# Altium footprint library Footprints.PcbLib: 266 footprints (part 10 of 17)
Each footprint in its own frame and in the unit in brackets; x right, y up, seen from the top. Pads: shape width x height; smd on the part's side, far side on the other; paste and mask are expansions set on the pad; w line width, h text height; cw(c..) or ccw(c..) is an arc to the next point about the centre after c.
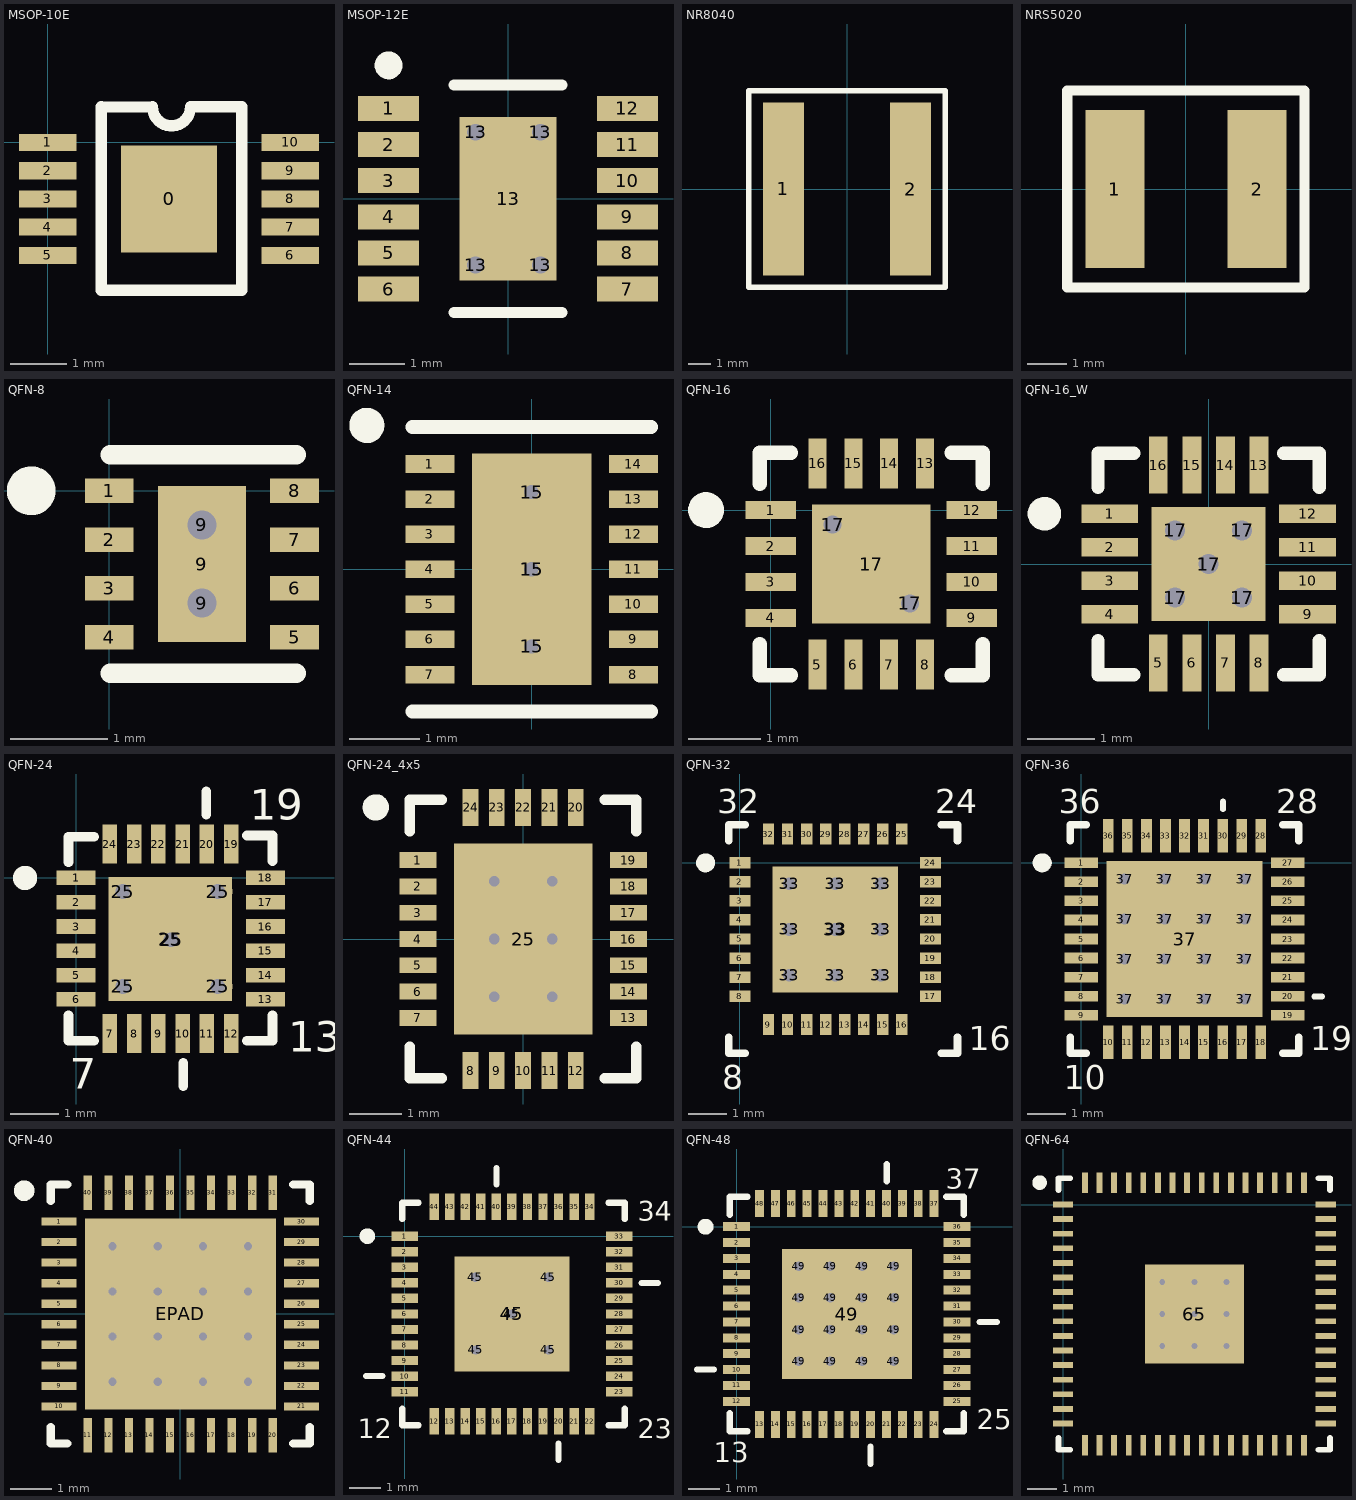
[diagram p9: the footprints below, top view; thin cyan lines are the x and y axes]

## MSOP-10E [mil] "TSOP, 10-Leads, Pitch 0,5mm, Exp PAD, IPC Medium Density"
pads (11):
  rect 66.93x74.8 smd: 0(84.65,-39.37)
  rect 40x12 smd: 1(0,0) 2(0,-19.68) 3(0,-39.37) 4(0,-59.05) 5(0,-78.74) 6(169.29,-78.74) 7(169.29,-59.05) 8(169.29,-39.37) 9(169.29,-19.68) 10(169.29,0)
Top Overlay:
  lines w7.87: 37.38,24 37.38,-103 135.41,-103 135.41,24 ; 37.38,24.84 73.1,24.8 ; 73.14,24.84 ccw(c86.39,24.84) 99.65,24.84 ; 99.6,24.9 135.41,24.84
3D body "User Library-msop-10.STEP": height 45.28, standoff 0, extent -11.81,-98.42 181.1,19.69

## MSOP-12E [mm] "TSOP, 12-Leads, Body 4,1x3,1mm (max), Pitch 0,65mm, Exp PAD, IPC Medium Density"
height 1.1
pads (17):
  rect 1.1x0.45 smd mask+0.076: 1(-2.15,1.625) 2(-2.15,0.975) 3(-2.15,0.325) 4(-2.15,-0.325) 5(-2.15,-0.975) 6(-2.15,-1.625) 7(2.15,-1.625) 8(2.15,-0.975) 9(2.15,-0.325) 10(2.15,0.325) 11(2.15,0.975) 12(2.15,1.625)
  round 0.5 hole 0.3: 13(-0.584,-1.194) 13(-0.584,1.194) 13(0.584,-1.194) 13(0.584,1.194)
  rect 1.75x2.95 smd paste-200 mask+0.076: 13(0,0)
Top Overlay:
  circle w0.25: c-2.15,2.4 r0.125
  lines w0.2: -0.975,-2.05 0.975,-2.05 ; -0.975,2.05 0.975,2.05
Top Paste:
  rectangle: -0.584,-0.94 0.584,0.94
3D body "User Library-msop-12.STEP": height 1.1, standoff 0, extent -2.475,-2.008 2.425,2.032

## NR8040 [mm]
pads (2):
  rect 1.8x7.6 smd: 1(-2.8,0) 2(2.8,0)
Top Overlay:
  lines w0.254: -4.318,-4.318 4.318,-4.318 4.318,4.318 -4.318,4.318 -4.318,-4.318
3D body: height 4.3, standoff 0.1, extent -3.556,-3.81 3.556,3.81

## NRS5020 [mm]
pads (2):
  rect 1.5x4 smd: 1(-1.8,0) 2(1.8,0)
Top Overlay:
  lines w0.254: -3.008,-2.5 -3.008,2.492 ; -3,-2.5 3,-2.5 ; -3,2.5 3,2.5 ; 3.008,-2.492 3.008,2.5
3D body: height 2.1, standoff 0.1, extent -2.286,-2.032 2.286,2.032

## QFN-8 [mm] "QFN, 8-Leads, Body 2,1x2,1mm (max), Pitch 0,50mm, IPC Medium Density"
height 0.8
pads (11):
  rect 0.5x0.25 smd mask+0.07: 1(0,0) 2(0,-0.5) 3(0,-1) 4(0,-1.5) 5(1.9,-1.5) 6(1.9,-1) 7(1.9,-0.5) 8(1.9,0)
  round 0.508 hole 0.3: 9(0.95,-1.15) 9(0.95,-0.35)
  rect 0.9x1.6 smd paste-0.12 mask+0.07: 9(0.95,-0.75)
Top Overlay:
  circle w0.25: c-0.8,0 r0.125
  lines w0.2: 0.01,-1.868 1.915,-1.868 ; 0.01,0.368 1.915,0.368
3D body: height 0.8, standoff 0.05, extent -0.038,-1.753 1.968,0.254

## QFN-14 [mm] "QFN, 14-Leads, Body 4,00x3,00mm, Pitch 0,50mm, Thermal Pad 3,30x1,70mm, IPC Medium Density"
height 1
pads (18):
  rect 0.7x0.25 smd: 1(-1.45,1.5) 2(-1.45,1) 3(-1.45,0.5) 4(-1.45,0) 5(-1.45,-0.5) 6(-1.45,-1) 7(-1.45,-1.5) 8(1.45,-1.5) 9(1.45,-1) 10(1.45,-0.5) 11(1.45,0) 12(1.45,0.5) 13(1.45,1) 14(1.45,1.5)
  round 0.5 hole 0.2: 15(0,-1.1) 15(0,0) 15(0,1.1)
  rect 1.7x3.3 smd: 15(0,0)
Top Overlay:
  circle w0.25: c-2.35,2.05 r0.125
  lines w0.2: -1.7,-2.025 1.7,-2.025 ; -1.7,2.025 1.7,2.025
3D body: height 1, standoff 0, extent -1.5,-2 1.5,2

## QFN-16 [mm] "QFN, 16-Leads, Body 3.0x3.0mm (max), Pitch 0.50mm, IPC Medium Density"
height 0.9
pads (19):
  rect 0.7x0.25 smd: 1(0,0) 2(0,-0.5) 3(0,-1) 4(0,-1.5) 9(2.8,-1.5) 10(2.8,-1) 11(2.8,-0.5) 12(2.8,0)
  rect 0.25x0.7 smd: 5(0.65,-2.15) 6(1.15,-2.15) 7(1.65,-2.15) 8(2.15,-2.15) 13(2.15,0.65) 14(1.65,0.65) 15(1.15,0.65) 16(0.65,0.65)
  round 0.559 hole 0.25: 17(0.864,-0.203) 17(1.936,-1.297)
  rect 1.65x1.65 smd paste-0.381: 17(1.4,-0.75)
Top Overlay:
  circle w0.25: c-0.9,0 r0.125
  lines w0.2: -0.15,-1.868 -0.15,-2.3 0.282,-2.3 ; -0.15,0.368 -0.15,0.8 0.282,0.8 ; 2.518,-2.3 2.95,-2.3 2.95,-1.868 ; 2.518,0.8 2.95,0.8 2.95,0.368
3D body "User Library-QFN-16_3x3.STEP": height 0.9, standoff 0, extent -0.127,-2.283 2.915,0.759

## QFN-16_W [mm] "QFN, 16-Leads, Body 3,3x3,3mm (max), Pitch 0,50mm, IPC Medium Density"
height 0.8
pads (22):
  rect 0.85x0.28 smd mask+0.076: 1(-1.475,0.75) 2(-1.475,0.25) 3(-1.475,-0.25) 4(-1.475,-0.75) 9(1.475,-0.75) 10(1.475,-0.25) 11(1.475,0.25) 12(1.475,0.75)
  rect 0.28x0.85 smd mask+0.076: 5(-0.75,-1.475) 6(-0.25,-1.475) 7(0.25,-1.475) 8(0.75,-1.475) 13(0.75,1.475) 14(0.25,1.475) 15(-0.25,1.475) 16(-0.75,1.475)
  round 0.559 hole 0.3: 17(-0.5,-0.5) 17(-0.5,0.5) 17(0,0) 17(0.5,-0.5) 17(0.5,0.5)
  rect 1.7x1.7 smd paste-100 mask+0.076: 17(0,0)
Top Overlay:
  circle w0.25: c-2.45,0.75 r0.125
  lines w0.2: -1.65,-1.143 -1.65,-1.65 -1.118,-1.65 ; -1.65,1.143 -1.65,1.65 -1.118,1.65 ; 1.118,-1.65 1.65,-1.65 1.65,-1.143 ; 1.118,1.65 1.65,1.65 1.65,1.143
Top Paste:
  rectangle: 0.1,0.1 0.8,0.8
  region: -0.1,0.8 -0.8,0.8 -0.8,0.1 -0.1,0.1
  region: -0.1,-0.1 -0.8,-0.1 -0.8,-0.8 -0.1,-0.8
  rectangle: 0.1,-0.8 0.8,-0.1
3D body: height 0.8, standoff 0.08, extent -1.65,-1.65 1.65,1.65

## QFN-24 [mm] "QFN, 24-Leads, Body 4,1x4,1mm (max), Pitch 0,50mm, IPC Low Density"
height 0.8
pads (30):
  rect 0.8x0.3 smd mask+0.07: 1(0,0) 2(0,-0.5) 3(0,-1) 4(0,-1.5) 5(0,-2) 6(0,-2.5) 13(3.9,-2.5) 14(3.9,-2) 15(3.9,-1.5) 16(3.9,-1) 17(3.9,-0.5) 18(3.9,0)
  rect 0.3x0.8 smd mask+0.07: 7(0.696,-3.204) 8(1.196,-3.204) 9(1.696,-3.204) 10(2.196,-3.204) 11(2.696,-3.204) 12(3.196,-3.204) 19(3.196,0.696) 20(2.696,0.696) 21(2.196,0.696) 22(1.696,0.696) 23(1.196,0.696) 24(0.696,0.696)
  round 0.6 hole 0.3 mask+0.07: 25(0.965,-2.235) 25(0.965,-0.279) 25(1.956,-1.27) 25(2.921,-2.235) 25(2.921,-0.279)
  rect 2.55x2.55 smd paste-200 mask+0.07: 25(1.941,-1.26)
Top Overlay:
  circle w0.25: c-1.05,0 r0.125
  lines w0.2: -0.155,-2.826 -0.155,-3.351 0.37,-3.351 ; -0.155,0.326 -0.155,0.851 0.37,0.851 ; 2.21,-4.293 2.21,-3.81 ; 2.682,1.302 2.682,1.785 ; 3.522,-3.351 4.047,-3.351 4.047,-2.826 ; 3.522,0.876 4.047,0.876 4.047,0.351
  text "7" at -0.127,-4.343 h0.64
  text "13" at 4.369,-3.581 h0.64
  text "19" at 3.581,1.194 h0.64
Top Paste:
  rectangle: 2.088,-2.393 3.088,-1.393
  region: 0.838,-1.393 0.838,-2.393 1.838,-2.393 1.838,-1.393
  rectangle: 2.088,-1.143 3.088,-0.143
  rectangle: 0.838,-1.143 1.838,-0.143
3D body "User Library-QFN24_4x4.STEP": height 1, standoff 0, extent -0.069,-3.273 3.951,0.747

## QFN-24_4x5 [mm] "24-pin QFN 4x5mm"
height 1
pads (25):
  rect 0.7x0.3 smd: 1(-2,1.5) 2(-2,1) 3(-2,0.5) 4(-2,0) 5(-2,-0.5) 6(-2,-1) 7(-2,-1.5) 13(2,-1.5) 14(2,-1) 15(2,-0.5) 16(2,0) 17(2,0.5) 18(2,1) 19(2,1.5)
  rect 0.3x0.7 smd: 8(-1,-2.5) 9(-0.5,-2.5) 10(0,-2.5) 11(0.5,-2.5) 12(1,-2.5) 20(1,2.5) 21(0.5,2.5) 22(0,2.5) 23(-0.5,2.5) 24(-1,2.5)
  rect 2.63x3.63 smd: 25(0,0)
via 0.55,-1.1 diameter 0.5 hole 0.2
via -0.55,-1.1 diameter 0.5 hole 0.2
via 0.55,0 diameter 0.5 hole 0.2
via -0.55,0 diameter 0.5 hole 0.2
via 0.55,1.1 diameter 0.5 hole 0.2
via -0.55,1.1 diameter 0.5 hole 0.2
Top Overlay:
  circle w0.25: c-2.8,2.5 r0.125
  lines w0.2: -2.15,-2.05 -2.15,-2.65 -1.55,-2.65 ; -2.15,2.05 -2.15,2.65 -1.55,2.65 ; 1.55,-2.65 2.15,-2.65 2.15,-2.05 ; 1.55,2.65 2.15,2.65 2.15,2.05
3D body: height 1, standoff 0, extent -2,-2.5 2,2.5

## QFN-32 [mm]
height 0.8
pads (42):
  rect 0.55x0.3 smd: 1(0,0) 2(0,-0.5) 3(0,-1) 4(0,-1.5) 5(0,-2) 6(0,-2.5) 7(0,-3) 8(0,-3.5) 17(5,-3.5) 18(5,-3) 19(5,-2.5) 20(5,-2) 21(5,-1.5) 22(5,-1) 23(5,-0.5) 24(5,0)
  rect 0.3x0.55 smd: 9(0.75,-4.25) 10(1.25,-4.25) 11(1.75,-4.25) 12(2.25,-4.25) 13(2.75,-4.25) 14(3.25,-4.25) 15(3.75,-4.25) 16(4.25,-4.25) 25(4.25,0.75) 26(3.75,0.75) 27(3.25,0.75) 28(2.75,0.75) 29(2.25,0.75) 30(1.75,0.75) 31(1.25,0.75) 32(0.75,0.75)
  round 0.66 hole 0.33: 33(1.3,-2.95) 33(1.3,-1.75) 33(1.3,-0.55) 33(2.5,-2.95) 33(2.5,-1.75) 33(2.5,-0.55) 33(3.7,-2.95) 33(3.7,-1.75) 33(3.7,-0.55)
  rect 3.3x3.3 smd paste-200: 33(2.5,-1.75)
Top Overlay:
  circle w0.25: c-0.9,0 r0.125
  lines w0.2: -0.29,-4.575 -0.29,-5 0.135,-5 ; -0.29,0.575 -0.29,1 0.135,1 ; 5.285,-5 5.71,-5 5.71,-4.575 ; 5.285,1 5.71,1 5.71,0.575
  text "8" at -0.465,-5.937 h0.64
  text "16" at 6.012,-4.921 h0.64
  text "24" at 5.123,1.302 h0.64
  text "32" at -0.592,1.302 h0.64
Top Paste:
  rectangle: 1.45,-1.65 2.375,-0.725
  rectangle: 2.65,-1.65 3.575,-0.725
  rectangle: 2.65,-2.85 3.575,-1.925
  rectangle: 1.45,-2.85 2.375,-1.925
3D body "User Library-qfn32-5x5.STEP": height 0.8, standoff 0, extent -0.02,-4.26 5,0.76

## QFN-36 [mm] "36-Pin Quad Flat No-lead (QFN)"
height 0.9
pads (53):
  rect 0.89x0.28 smd mask+0.07: 1(0,0) 2(0,-0.5) 3(0,-1) 4(0,-1.5) 5(0,-2) 6(0,-2.5) 7(0,-3) 8(0,-3.5) 9(0,-4) 19(5.42,-4) 20(5.42,-3.5) 21(5.42,-3) 22(5.42,-2.5) 23(5.42,-2) 24(5.42,-1.5) 25(5.42,-1) 26(5.42,-0.5) 27(5.42,0)
  rect 0.28x0.89 smd mask+0.07: 10(0.71,-4.71) 11(1.21,-4.71) 12(1.71,-4.71) 13(2.21,-4.71) 14(2.71,-4.71) 15(3.21,-4.71) 16(3.71,-4.71) 17(4.21,-4.71) 18(4.71,-4.71) 28(4.71,0.71) 29(4.21,0.71) 30(3.71,0.71) 31(3.21,0.71) 32(2.71,0.71) 33(2.21,0.71) 34(1.71,0.71) 35(1.21,0.71) 36(0.71,0.71)
  round 0.559 hole 0.3: 37(1.135,-3.575) 37(1.135,-2.525) 37(1.135,-1.475) 37(1.135,-0.425) 37(2.185,-3.575) 37(2.185,-2.525) 37(2.185,-1.475) 37(2.185,-0.425) 37(3.235,-3.575) 37(3.235,-2.525) 37(3.235,-1.475) 37(3.235,-0.425) 37(4.285,-3.575) 37(4.285,-2.525) 37(4.285,-1.475) 37(4.285,-0.425)
  rect 4.1x4.1 smd paste-200 mask+0.07: 37(2.71,-2)
Top Overlay:
  circle w0.25: c-1.025,0 r0.125
  lines w0.152: 3.717,1.404 3.717,1.607 ; 6.114,-3.507 6.317,-3.507
  lines w0.2: -0.29,-4.575 -0.29,-5 0.135,-5 ; -0.29,0.575 -0.29,1 0.135,1 ; 5.285,-5 5.71,-5 5.71,-4.575 ; 5.285,1 5.71,1 5.71,0.575
  text "10" at -0.465,-5.937 h0.64
  text "19" at 6.012,-4.921 h0.64
  text "28" at 5.123,1.302 h0.64
  text "36" at -0.592,1.302 h0.64
Top Paste:
  rectangle: 0.742,-0.832 1.542,-0.032
  rectangle: 1.792,-0.832 2.592,-0.032
  rectangle: 2.842,-0.832 3.642,-0.032
  rectangle: 3.892,-0.832 4.692,-0.032
  rectangle: 3.892,-1.882 4.692,-1.082
  rectangle: 2.842,-1.882 3.642,-1.082
  rectangle: 1.792,-1.882 2.592,-1.082
  rectangle: 0.742,-1.882 1.542,-1.082
  rectangle: 0.742,-2.932 1.542,-2.132
  rectangle: 1.792,-2.932 2.592,-2.132
  rectangle: 2.842,-2.932 3.642,-2.132
  rectangle: 3.892,-2.932 4.692,-2.132
  rectangle: 3.892,-3.982 4.692,-3.182
  rectangle: 2.842,-3.982 3.642,-3.182
  rectangle: 1.792,-3.982 2.592,-3.182
  rectangle: 0.742,-3.982 1.542,-3.182
3D body "User Library-QFN36 (6x6).STEP": height 0.9, standoff 0.01, extent -0.381,-5.084 5.824,1.121

## QFN-40 [mm] "40-pin 6mm x 6mm QFN"
height 0.8
pads (41):
  rect 0.85x0.2 smd: 1(-2.95,2.25) 2(-2.95,1.75) 3(-2.95,1.25) 4(-2.95,0.75) 5(-2.95,0.25) 6(-2.95,-0.25) 7(-2.95,-0.75) 8(-2.95,-1.25) 9(-2.95,-1.75) 10(-2.95,-2.25) 21(2.95,-2.25) 22(2.95,-1.75) 23(2.95,-1.25) 24(2.95,-0.75) 25(2.95,-0.25) 26(2.95,0.25) 27(2.95,0.75) 28(2.95,1.25) 29(2.95,1.75) 30(2.95,2.25)
  rect 0.2x0.85 smd: 11(-2.25,-2.95) 12(-1.75,-2.95) 13(-1.25,-2.95) 14(-0.75,-2.95) 15(-0.25,-2.95) 16(0.25,-2.95) 17(0.75,-2.95) 18(1.25,-2.95) 19(1.75,-2.95) 20(2.25,-2.95) 31(2.25,2.95) 32(1.75,2.95) 33(1.25,2.95) 34(0.75,2.95) 35(0.25,2.95) 36(-0.25,2.95) 37(-0.75,2.95) 38(-1.25,2.95) 39(-1.75,2.95) 40(-2.25,2.95)
  rect 4.65x4.65 smd paste-1000: EPAD(0,0)
via 1.65,-1.65 diameter 0.5 hole 0.2
via 0.55,-1.65 diameter 0.5 hole 0.2
via -0.55,-1.65 diameter 0.5 hole 0.2
via -1.65,-1.65 diameter 0.5 hole 0.2
via 1.65,-0.55 diameter 0.5 hole 0.2
via 0.55,-0.55 diameter 0.5 hole 0.2
via -0.55,-0.55 diameter 0.5 hole 0.2
via -1.65,-0.55 diameter 0.5 hole 0.2
via 1.65,0.55 diameter 0.5 hole 0.2
via 0.55,0.55 diameter 0.5 hole 0.2
via -0.55,0.55 diameter 0.5 hole 0.2
via -1.65,0.55 diameter 0.5 hole 0.2
via 1.65,1.65 diameter 0.5 hole 0.2
via 0.55,1.65 diameter 0.5 hole 0.2
via -0.55,1.65 diameter 0.5 hole 0.2
via -1.65,1.65 diameter 0.5 hole 0.2
Top Overlay:
  circle w0.25: c-3.8,3 r0.125
  lines w0.2: -3.15,-2.75 -3.15,-3.15 -2.75,-3.15 ; -3.15,2.75 -3.15,3.15 -2.75,3.15 ; 2.75,-3.15 3.15,-3.15 3.15,-2.75 ; 2.75,3.15 3.15,3.15 3.15,2.75
Top Paste:
  rectangle: -1.65,-1.65 -0.55,-0.55
  rectangle: -1.65,0.55 -0.55,1.65
  rectangle: 0.55,0.55 1.65,1.65
  rectangle: 0.55,-1.65 1.65,-0.55
  rectangle: -0.55,-0.55 0.55,0.55
  rectangle: 1.651,-0.516 2.311,0.584
  region: 0.516,1.651 0.516,2.311 -0.584,2.311 -0.584,1.651
  region: -0.584,-1.651 -0.584,-2.311 0.516,-2.311 0.516,-1.651
  region: -1.651,0.584 -2.311,0.584 -2.311,-0.516 -1.651,-0.516
  region: -1.651,2.311 -2.311,2.311 -2.311,1.616 -1.651,1.616
  rectangle: 1.651,1.616 2.311,2.311
  rectangle: 1.651,-2.311 2.311,-1.616
  region: -1.651,-1.616 -2.311,-1.616 -2.311,-2.311 -1.651,-2.311
3D body "User Library-QFN40.STEP": height 0.8, standoff 0, extent -3,-3 3,3

## QFN-44 [mm] "QFN, 44-Leads, Body 7,1x7,1mm (max), Pitch 0,50mm, IPC Low Density"
height 1
pads (50):
  rect 0.85x0.3 smd: 1(0,0) 2(0,-0.5) 3(0,-1) 4(0,-1.5) 5(0,-2) 6(0,-2.5) 7(0,-3) 8(0,-3.5) 9(0,-4) 10(0,-4.5) 11(0,-5) 23(6.9,-5) 24(6.9,-4.5) 25(6.9,-4) 26(6.9,-3.5) 27(6.9,-3) 28(6.9,-2.5) 29(6.9,-2) 30(6.9,-1.5) 31(6.9,-1) 32(6.9,-0.5) 33(6.9,0)
  rect 0.3x0.85 smd: 12(0.948,-5.952) 13(1.448,-5.952) 14(1.948,-5.952) 15(2.448,-5.952) 16(2.948,-5.952) 17(3.448,-5.952) 18(3.948,-5.952) 19(4.448,-5.952) 20(4.948,-5.952) 21(5.448,-5.952) 22(5.948,-5.952) 34(5.948,0.948) 35(5.448,0.948) 36(4.948,0.948) 37(4.448,0.948) 38(3.948,0.948) 39(3.448,0.948) 40(2.948,0.948) 41(2.448,0.948) 42(1.948,0.948) 43(1.448,0.948) 44(0.948,0.948)
  round 0.6 hole 0.3 mask+0.07: 45(2.273,-1.325) 45(2.286,-3.658) 45(3.448,-2.5) 45(4.623,-3.658) 45(4.623,-1.321)
  rect 3.7x3.7 smd paste-200 mask+0.07: 45(3.448,-2.5)
Top Overlay:
  circle w0.25: c-1.2,0 r0.125
  lines w0.2: -1.245,-4.496 -0.711,-4.496 ; 2.952,1.659 2.952,2.192 ; 4.943,-7.197 4.943,-6.664 ; 7.611,-1.504 8.145,-1.504
  lines w0.203: -0.077,-5.552 -0.077,-6.075 0.446,-6.075 ; -0.077,0.552 -0.077,1.075 0.446,1.075 ; 6.55,-6.075 7.074,-6.075 7.074,-5.552 ; 6.55,1.075 7.074,1.075 7.074,0.552
  text "34" at 7.5,0.5 h0.64
  text "23" at 7.5,-6.5 h0.64
  text "12" at -1.5,-6.5 h0.64
Top Paste:
  rectangle: 3.555,-3.674 4.555,-2.674
  region: 2.305,-2.674 2.305,-3.674 3.305,-3.674 3.305,-2.674
  rectangle: 3.555,-2.424 4.555,-1.424
  rectangle: 2.305,-2.424 3.305,-1.424
3D body "User Library-smd_qfn-44-2.STEP": height 0.9, standoff 0, extent -0.053,-6.003 6.949,0.999

## QFN-48 [mm] "QFN, 48-Leads, Body 7,2x7,2mm (max), Pitch 0,50mm, IPC Medium Density"
height 1
pads (65):
  rect 0.85x0.28 smd paste-0.02 mask+0.076: 1(0,0) 2(0,-0.5) 3(0,-1) 4(0,-1.5) 5(0,-2) 6(0,-2.5) 7(0,-3) 8(0,-3.5) 9(0,-4) 10(0,-4.5) 11(0,-5) 12(0,-5.5) 25(6.95,-5.5) 26(6.95,-5) 27(6.95,-4.5) 28(6.95,-4) 29(6.95,-3.5) 30(6.95,-3) 31(6.95,-2.5) 32(6.95,-2) 33(6.95,-1.5) 34(6.95,-1) 35(6.95,-0.5) 36(6.95,0)
  rect 0.28x0.85 smd paste-0.02 mask+0.076: 13(0.725,-6.225) 14(1.225,-6.225) 15(1.725,-6.225) 16(2.225,-6.225) 17(2.725,-6.225) 18(3.225,-6.225) 19(3.725,-6.225) 20(4.225,-6.225) 21(4.725,-6.225) 22(5.225,-6.225) 23(5.725,-6.225) 24(6.225,-6.225) 37(6.225,0.725) 38(5.725,0.725) 39(5.225,0.725) 40(4.725,0.725) 41(4.225,0.725) 42(3.725,0.725) 43(3.225,0.725) 44(2.725,0.725) 45(2.225,0.725) 46(1.725,0.725) 47(1.225,0.725) 48(0.725,0.725)
  round 0.5 hole 0.3: 49(1.956,-4.245) 49(1.956,-3.245) 49(1.956,-2.245) 49(1.956,-1.245) 49(2.956,-4.245) 49(2.956,-3.245) 49(2.956,-2.245) 49(2.956,-1.245) 49(3.956,-4.245) 49(3.956,-3.245) 49(3.956,-2.245) 49(3.956,-1.245) 49(4.956,-4.245) 49(4.956,-3.245) 49(4.956,-2.245) 49(4.956,-1.245)
  rect 4.1x4.1 smd paste-200 mask+0.076: 49(3.475,-2.75)
Top Overlay:
  circle w0.25: c-0.975,0 r0.125
  lines w0.2: -1.245,-4.496 -0.711,-4.496 ; 4.221,-7.47 4.221,-6.936 ; 4.729,1.436 4.729,1.97 ; 7.661,-3.004 8.195,-3.004
  lines w0.203: -0.213,-5.881 -0.213,-6.44 0.346,-6.44 ; -0.213,0.381 -0.213,0.94 0.346,0.94 ; 6.604,-6.44 7.163,-6.44 7.163,-5.881 ; 6.604,0.94 7.163,0.94 7.163,0.381
  text "13" at -0.711,-7.417 h0.64
  text "25" at 7.569,-6.375 h0.64
  text "37" at 6.596,1.203 h0.64
Top Paste:
  rectangle: 1.441,-4.775 2.591,-3.625
  rectangle: 2.889,-4.775 4.039,-3.625
  rectangle: 4.336,-4.775 5.486,-3.625
  rectangle: 1.441,-3.327 2.591,-2.177
  rectangle: 2.889,-3.327 4.039,-2.177
  rectangle: 4.336,-3.327 5.486,-2.177
  rectangle: 4.336,-1.88 5.486,-0.73
  rectangle: 2.889,-1.88 4.039,-0.73
  rectangle: 1.441,-1.88 2.591,-0.73
3D body "User Library-QFN48_7x7.STEP": height 0.78, standoff -0.02, extent -0.03,-6.248 6.99,0.772

## QFN-64 [mm]
height 1
pads (65):
  rect 0.7x0.2 smd: 1(0,0) 2(0,-0.5) 3(0,-1) 4(0,-1.5) 5(0,-2) 6(0,-2.5) 7(0,-3) 8(0,-3.5) 9(0,-4) 10(0,-4.5) 11(0,-5) 12(0,-5.5) 13(0,-6) 14(0,-6.5) 15(0,-7) 16(0,-7.5) 33(9,-7.5) 34(9,-7) 35(9,-6.5) 36(9,-6) 37(9,-5.5) 38(9,-5) 39(9,-4.5) 40(9,-4) 41(9,-3.5) 42(9,-3) 43(9,-2.5) 44(9,-2) 45(9,-1.5) 46(9,-1) 47(9,-0.5) 48(9,0)
  rect 0.2x0.7 smd: 17(0.75,-8.25) 18(1.25,-8.25) 19(1.75,-8.25) 20(2.25,-8.25) 21(2.75,-8.25) 22(3.25,-8.25) 23(3.75,-8.25) 24(4.25,-8.25) 25(4.75,-8.25) 26(5.25,-8.25) 27(5.75,-8.25) 28(6.25,-8.25) 29(6.75,-8.25) 30(7.25,-8.25) 31(7.75,-8.25) 32(8.25,-8.25) 49(8.25,0.75) 50(7.75,0.75) 51(7.25,0.75) 52(6.75,0.75) 53(6.25,0.75) 54(5.75,0.75) 55(5.25,0.75) 56(4.75,0.75) 57(4.25,0.75) 58(3.75,0.75) 59(3.25,0.75) 60(2.75,0.75) 61(2.25,0.75) 62(1.75,0.75) 63(1.25,0.75) 64(0.75,0.75)
  rect 3.4x3.4 smd: 65(4.5,-3.75)
via 5.6,-4.85 diameter 0.5 hole 0.2
via 4.5,-4.85 diameter 0.5 hole 0.2
via 3.4,-4.85 diameter 0.5 hole 0.2
via 5.6,-3.75 diameter 0.5 hole 0.2
via 4.5,-3.75 diameter 0.5 hole 0.2
via 3.4,-3.75 diameter 0.5 hole 0.2
via 5.6,-2.65 diameter 0.5 hole 0.2
via 4.5,-2.65 diameter 0.5 hole 0.2
via 3.4,-2.65 diameter 0.5 hole 0.2
Top Overlay:
  circle w0.25: c-0.8,0.75 r0.125
  lines w0.2: -0.15,-8 -0.15,-8.4 0.25,-8.4 ; -0.15,0.5 -0.15,0.9 0.25,0.9 ; 8.75,-8.4 9.15,-8.4 9.15,-8 ; 8.75,0.9 9.15,0.9 9.15,0.5
3D body "User Library-QFN64-2.STEP": height 0.9, standoff 0, extent -0.02,-8.27 9.02,0.77